# Altium footprint library DrPCB.PcbLib: 910 footprints (part 26 of 57)
Each footprint in its own frame and in the unit in brackets; x right, y up, seen from the top. Pads: shape width x height; smd on the part's side, far side on the other; paste and mask are expansions set on the pad; w line width, h text height; cw(c..) or ccw(c..) is an arc to the next point about the centre after c.
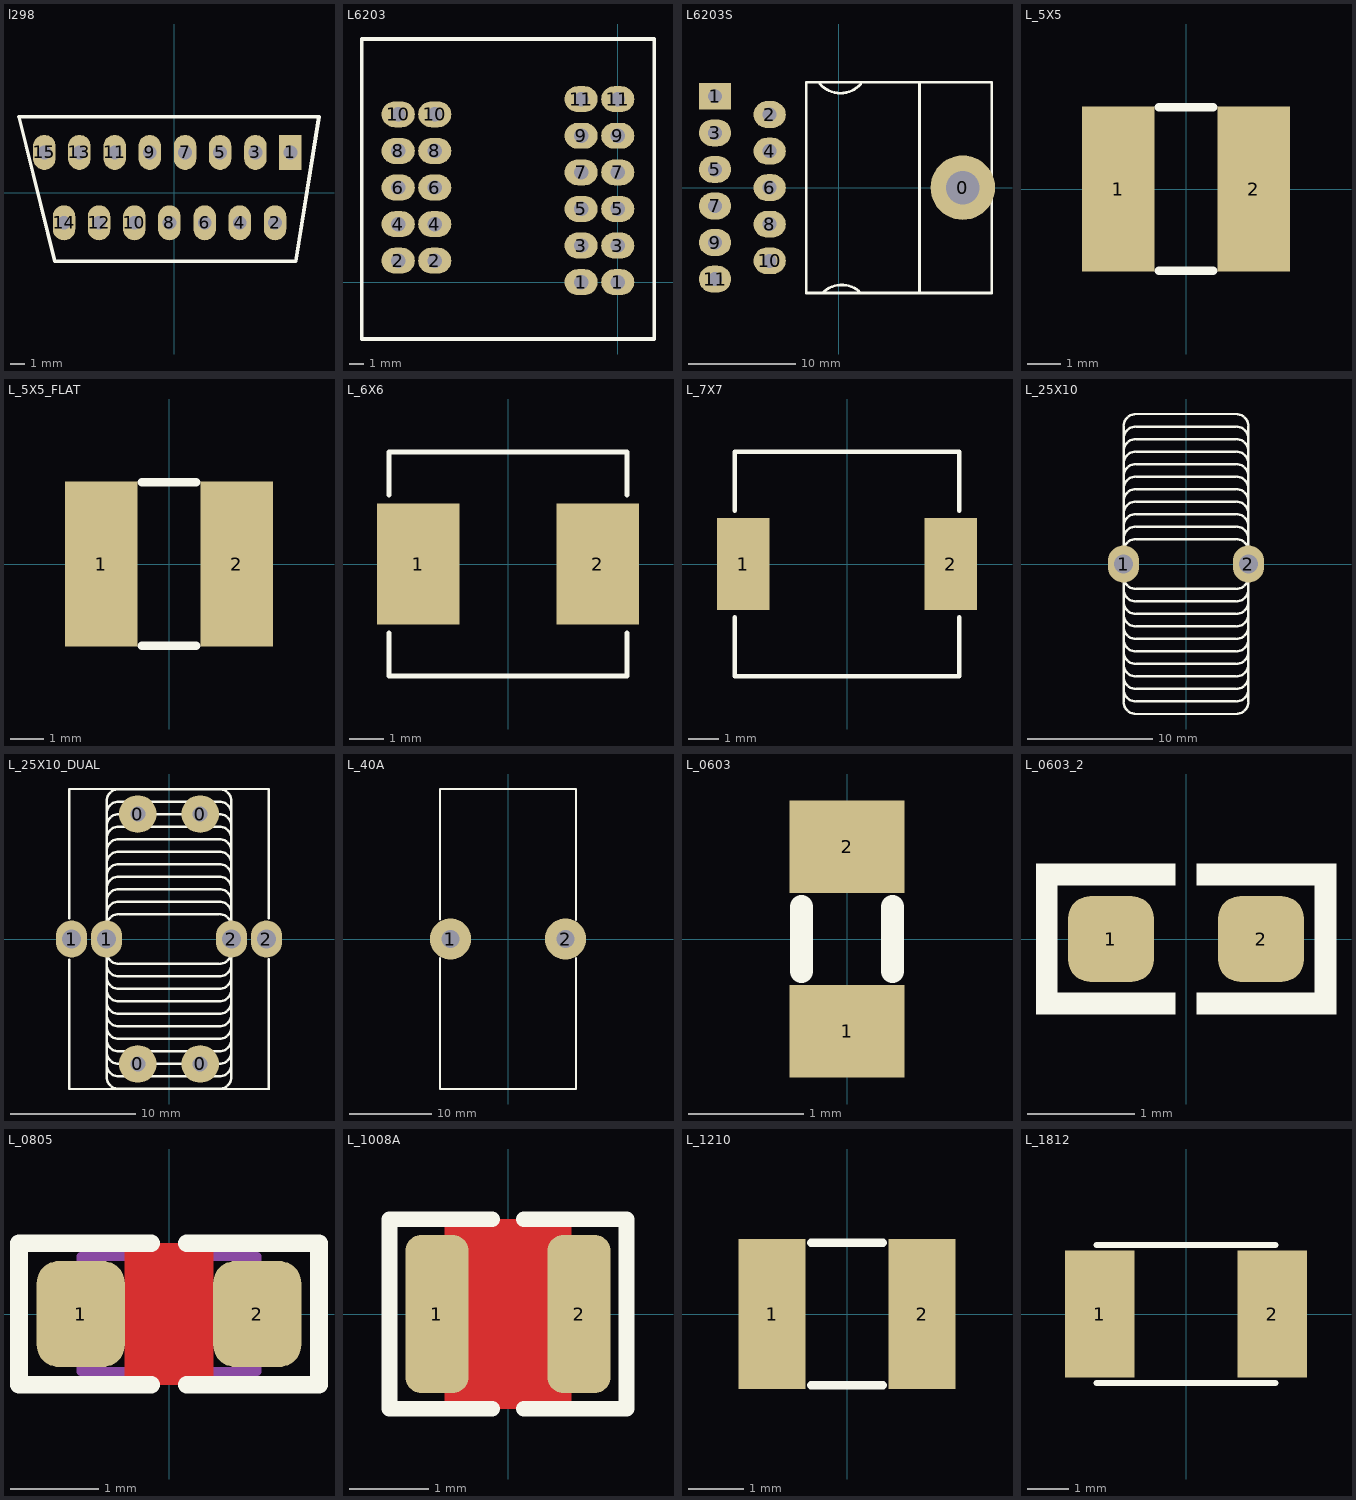
[diagram p25: the footprints below, top view; thin cyan lines are the x and y axes]

## l298 [mil]
pads (15):
  rect 63x98 hole 39: 1(325.31,112.4)
  oval 63x98 hole 39: 2(282.31,-84.6) 3(227.31,112.4) 4(183.31,-84.6) 5(128.31,112.4) 6(85.31,-84.6) 7(30.31,112.4) 8(-13.69,-84.6) 9(-68.69,112.4) 10(-111.69,-84.6) 11(-166.69,112.4) 12(-210.69,-84.6) 13(-265.69,112.4) 14(-308.69,-84.6) 15(-363.69,112.4)
Top Overlay:
  lines w10: -434.69,212.4 405.31,212.4 340.31,-192.6 -334.69,-192.6 -434.69,212.4

## L6203 [mm]
pads (22):
  oval 2.3x1.8 hole 1: 1(-2.54,0) 1(0,0) 2(-15.24,1.487) 2(-12.7,1.487) 3(-2.54,2.54) 3(0,2.54) 4(-15.24,4.027) 4(-12.7,4.027) 5(-2.54,5.08) 5(0,5.08) 6(-15.24,6.567) 6(-12.7,6.567) 7(-2.54,7.62) 7(0,7.62) 8(-15.24,9.107) 8(-12.7,9.107) 9(-2.54,10.16) 9(0,10.16) 10(-15.24,11.647) 10(-12.7,11.647) 11(-2.54,12.7) 11(0,12.7)
Top Overlay:
  lines w0.254: -17.78,-3.948 -17.78,16.876 ; -17.775,-3.948 2.545,-3.948 ; -17.775,16.876 2.545,16.876 ; 2.54,-3.948 2.54,16.859

## L6203S [mm]
pads (12):
  round 6 hole 3.1: 0(11.518,0)
  rect 3x2.5 hole 1.3: 1(-11.518,8.5)
  oval 3x2.5 hole 1.3: 2(-6.438,6.8) 3(-11.518,5.1) 4(-6.438,3.4) 5(-11.518,1.7) 6(-6.438,0) 7(-11.518,-1.7) 8(-6.438,-3.4) 9(-11.518,-5.1) 10(-6.438,-6.8) 11(-11.518,-8.5)
Top Overlay:
  lines w0.254: -1.773,9.652 ccw(c0.132,11.303) 2.037,9.652 ; -1.519,-9.779 cw(c0.259,-11.557) 2.037,-9.779 ; 7.498,-9.652 7.498,9.652 ; -3.032,-9.8 -3.032,9.8 14.218,9.8 14.218,-9.8 ; -3.032,-9.8 14.218,-9.8 ; -3.032,-9.8 14.218,-9.8

## L_5X5 [mm]
pads (2):
  rect 2.2x5 smd: 1(-2.05,0) 2(2.05,0)
Top Overlay:
  lines w0.254: -0.826,-2.476 0.826,-2.476 ; -0.826,2.475 0.826,2.475
3D body: height 0.25, standoff 0, extent -0.14,-0.445 -0.14,-0.445
3D body "User Library-SRN5040.STEP": height 4.01, standoff 0.01, extent -2.5,-2.5 2.5,2.5

## L_5X5_FLAT [mm]
pads (2):
  rect 2.2x5 smd: 1(-2.05,0) 2(2.05,0)
Top Overlay:
  lines w0.254: -0.826,-2.476 0.826,-2.476 ; -0.826,2.475 0.826,2.475
3D body: height 0.25, standoff 0, extent -0.14,-0.445 -0.14,-0.445
3D body "User Library-DLW5BT.STEP": height 2.45, standoff 0, extent -2.5,-2.5 2.5,2.5

## L_6X6 [mm]
pads (2):
  rect 2.4x3.5 smd: 1(-2.603,0) 2(2.603,0)
Top Overlay:
  lines w0.15: -3.45,-2.007 -3.45,-3.25 3.45,-3.25 3.45,-2.007 ; -3.45,2.007 -3.45,3.25 3.45,3.25 3.45,2.007
3D body "IHLP2525BD (1.5-10uH).STEP": height 2.28, standoff 0, extent -3.487,-3.335 3.487,3.335

## L_7X7 [mm]
pads (2):
  rect 1.7x3 smd: 1(-3.375,0) 2(3.375,0)
Top Overlay:
  lines w0.15: -3.65,-1.725 -3.65,-3.65 3.65,-3.65 3.65,-1.725 ; -3.65,1.725 -3.65,3.65 3.65,3.65 3.65,1.725
3D body "User Library-Murata_4600.step": height 4.55, standoff 0, extent -3.714,-3.65 3.714,3.65

## L_25X10 [mm] "INDUCTOR, TORIOD, 25.0X10.0mm"
pads (2):
  oval 2.5x3 hole 1.5: 1(-5,0) 2(5,0)
Top Overlay:
  lines w0.2: -5,-10 ccw(c-4,-10) -4,-11 4,-11 ccw(c4,-10) 5,-10 ; -5,-9 ccw(c-4,-9) -4,-10 4,-10 ccw(c4,-9) 5,-9 ; -5,-8 ccw(c-4,-8) -4,-9 4,-9 ccw(c4,-8) 5,-8 ; -5,-7 ccw(c-4,-7) -4,-8 4,-8 ccw(c4,-7) 5,-7 ; -5,-6 ccw(c-4,-6) -4,-7 4,-7 ccw(c4,-6) 5,-6 ; -5,-5 ccw(c-4,-5) -4,-6 4,-6 ccw(c4,-5) 5,-5 ; -5,-4 ccw(c-4,-4) -4,-5 4,-5 ccw(c4,-4) 5,-4 ; -5,-3 ccw(c-4,-3) -4,-4 4,-4 ccw(c4,-3) 5,-3 ; -5,-2 ccw(c-4,-2) -4,-3 4,-3 ccw(c4,-2) 5,-2 ; -5,-1.3 -5,-11 ccw(c-4,-11) -4,-12 4,-12 ccw(c4,-11) 5,-11 5,-1.3 ; -5,-1 ccw(c-4,-1) -4,-2 4,-2 ccw(c4,-1) 5,-1 ; -5,1 cw(c-4,1) -4,2 4,2 cw(c4,1) 5,1 ; -5,1.3 -5,11 cw(c-4,11) -4,12 4,12 cw(c4,11) 5,11 5,1.3 ; -5,2 cw(c-4,2) -4,3 4,3 cw(c4,2) 5,2 ; -5,3 cw(c-4,3) -4,4 4,4 cw(c4,3) 5,3 ; -5,4 cw(c-4,4) -4,5 4,5 cw(c4,4) 5,4 ; -5,5 cw(c-4,5) -4,6 4,6 cw(c4,5) 5,5 ; -5,6 cw(c-4,6) -4,7 4,7 cw(c4,6) 5,6 ; -5,7 cw(c-4,7) -4,8 4,8 cw(c4,7) 5,7 ; -5,8 cw(c-4,8) -4,9 4,9 cw(c4,8) 5,8 ; -5,9 cw(c-4,9) -4,10 4,10 cw(c4,9) 5,9 ; -5,10 cw(c-4,10) -4,11 4,11 cw(c4,10) 5,10
3D body "User Library-5701-RC.STEP": height 23.03, standoff -12, extent -5.62,-11.21 5.7,11.21

## L_25X10_DUAL [mm] "INDUCTOR, TORIOD, 25.0X10.0mm"
pads (8):
  round 3 hole 1.2: 0(-2.5,-10) 0(-2.5,10) 0(2.5,-10) 0(2.5,10)
  oval 2.5x3 hole 1.5: 1(-7.8,0) 1(-5,0) 2(5,0) 2(7.8,0)
Top Overlay:
  lines w0.2: -8,-1.65 -8,-12.002 7.988,-12.002 8,-11.99 8,-1.638 ; -8,1.65 -8,12.002 7.988,12.002 7.988,1.65 ; -5,-10 ccw(c-4,-10) -4,-11 4,-11 ccw(c4,-10) 5,-10 ; -5,-9 ccw(c-4,-9) -4,-10 4,-10 ccw(c4,-9) 5,-9 ; -5,-8 ccw(c-4,-8) -4,-9 4,-9 ccw(c4,-8) 5,-8 ; -5,-7 ccw(c-4,-7) -4,-8 4,-8 ccw(c4,-7) 5,-7 ; -5,-6 ccw(c-4,-6) -4,-7 4,-7 ccw(c4,-6) 5,-6 ; -5,-5 ccw(c-4,-5) -4,-6 4,-6 ccw(c4,-5) 5,-5 ; -5,-4 ccw(c-4,-4) -4,-5 4,-5 ccw(c4,-4) 5,-4 ; -5,-3 ccw(c-4,-3) -4,-4 4,-4 ccw(c4,-3) 5,-3 ; -5,-2 ccw(c-4,-2) -4,-3 4,-3 ccw(c4,-2) 5,-2 ; -5,-1.3 -5,-11 ccw(c-4,-11) -4,-12 4,-12 ccw(c4,-11) 5,-11 5,-1.3 ; -5,-1 ccw(c-4,-1) -4,-2 4,-2 ccw(c4,-1) 5,-1 ; -5,1 cw(c-4,1) -4,2 4,2 cw(c4,1) 5,1 ; -5,1.3 -5,11 cw(c-4,11) -4,12 4,12 cw(c4,11) 5,11 5,1.3 ; -5,2 cw(c-4,2) -4,3 4,3 cw(c4,2) 5,2 ; -5,3 cw(c-4,3) -4,4 4,4 cw(c4,3) 5,3 ; -5,4 cw(c-4,4) -4,5 4,5 cw(c4,4) 5,4 ; -5,5 cw(c-4,5) -4,6 4,6 cw(c4,5) 5,5 ; -5,6 cw(c-4,6) -4,7 4,7 cw(c4,6) 5,6 ; -5,7 cw(c-4,7) -4,8 4,8 cw(c4,7) 5,7 ; -5,8 cw(c-4,8) -4,9 4,9 cw(c4,8) 5,8 ; -5,9 cw(c-4,9) -4,10 4,10 cw(c4,9) 5,9 ; -5,10 cw(c-4,10) -4,11 4,11 cw(c4,10) 5,10
3D body "User Library-5701-RC.STEP": height 23.03, standoff -12, extent -5.62,-11.21 5.7,11.21

## L_40A [mm]
pads (2):
  round 5 hole 2.2: 1(-7,0) 2(7,0)
Top Overlay:
  lines w0.254: -8.25,-2.324 -8.25,-18.25 8.25,-18.25 ; -8.25,2.375 -8.25,18.25 8.25,18.25 8.25,2.337 ; 8.25,-18.224 8.25,-2.324

## L_0603 [mm]
pads (2):
  rect 1x0.8 smd: 1(0,-0.8) 2(0,0.8)
Top Overlay:
  lines w0.2: -0.394,-0.279 -0.394,0.279 ; 0.394,-0.279 0.394,0.279
3D body "INDC-0603.stp": height 0.95, standoff 0, extent -0.475,-0.875 0.475,0.875

## L_0603_2 [mm] "INDUCTOR, FERRITE BEAD, 0603, 1.6X0.8mm"
height 0.6
pads (2):
  rrect50% 0.8x0.8 smd paste-5 mask+0.075: 1(-0.7,0) 2(0.7,0)
Top Overlay:
  region: 0.1,-0.5 0.1,-0.7 1.4,-0.7 1.4,-0.5
  region: 0.1,0.5 0.1,0.7 1.4,0.7 1.4,0.5
  region: 1.4,0.7 1.2,0.7 1.2,-0.7 1.4,-0.7
  region: -1.4,0.7 -1.2,0.7 -1.2,-0.7 -1.4,-0.7
  region: -0.1,0.5 -0.1,0.7 -1.4,0.7 -1.4,0.5
  region: -0.1,-0.5 -0.1,-0.7 -1.4,-0.7 -1.4,-0.5
Top Paste:
  region: 0.7,0.35 0.63,0.35 0.502,0.297 0.403,0.198 0.35,0.07 0.35,0 0.35,-0.07 0.403,-0.198 0.502,-0.297 0.63,-0.35 0.7,-0.35 0.9,-0.35 0.93,-0.35 0.985,-0.327 1.027,-0.285 1.05,-0.23 1.05,-0.2 1.05,0.2 1.05,0.23 1.027,0.285 0.985,0.327 0.93,0.35 0.9,0.35
  region: -0.7,0.35 -0.63,0.35 -0.502,0.297 -0.403,0.198 -0.35,0.07 -0.35,0 -0.35,-0.07 -0.403,-0.198 -0.502,-0.297 -0.63,-0.35 -0.7,-0.35 -0.9,-0.35 -0.93,-0.35 -0.985,-0.327 -1.027,-0.285 -1.05,-0.23 -1.05,-0.2 -1.05,0.2 -1.05,0.23 -1.027,0.285 -0.985,0.327 -0.93,0.35 -0.9,0.35
3D body "User Library-Chip Inductor0603.step": height 0.95, standoff 0, extent -0.8,-0.4 0.8,0.4

## L_0805 [mm] "INDUCTOR, FERRITE BEAD, 0805, 2.0X1.3mm"
pads (2):
  rrect50% 1x1.2 smd paste-5 mask+0.075: 1(-1,0) 2(1,0)
Top Layer:
  pour cut-out: -0.5,0.8 0.5,0.8 0.5,-0.8 -0.5,-0.8
Top Overlay:
  lines w0.2: -0.2,-0.8 -1.7,-0.8 -1.7,0.8 -0.2,0.8 ; 0.2,-0.8 1.7,-0.8 1.7,0.8 0.2,0.8
Top Paste:
  region: 0.9,0.5 0.82,0.5 0.673,0.439 0.561,0.327 0.5,0.18 0.5,0.1 0.5,-0.1 0.5,-0.18 0.561,-0.327 0.673,-0.439 0.82,-0.5 0.9,-0.5 1.15,-0.5 1.18,-0.5 1.235,-0.477 1.277,-0.435 1.3,-0.38 1.3,-0.35 1.3,0.35 1.3,0.38 1.277,0.435 1.235,0.477 1.18,0.5 1.15,0.5
  region: -0.9,0.5 -0.82,0.5 -0.673,0.439 -0.561,0.327 -0.5,0.18 -0.5,0.1 -0.5,-0.1 -0.5,-0.18 -0.561,-0.327 -0.673,-0.439 -0.82,-0.5 -0.9,-0.5 -1.15,-0.5 -1.18,-0.5 -1.235,-0.477 -1.277,-0.435 -1.3,-0.38 -1.3,-0.35 -1.3,0.35 -1.3,0.38 -1.277,0.435 -1.235,0.477 -1.18,0.5 -1.15,0.5
Mechanical 13:
  lines w0.1: -1,-0.65 1,-0.65 1,0.65 -1,0.65 -1,-0.65
3D body "User Library-ind_0805.step": height 0.95, standoff 0, extent -1,-0.6 1,0.6

## L_1008A [mm] "INDUCTOR, 2520 1008, 2.5X2.0mm, for PCBA"
pads (2):
  rrect50% 0.8x2 smd paste-0.1: 1(-0.9,0) 2(0.9,0)
Top Layer:
  pour cut-out: -0.8,1.2 -0.8,-1.2 0.8,-1.2 0.8,1.2
Top Overlay:
  lines w0.2: -0.2,-1.2 -1.5,-1.2 -1.5,1.2 -0.2,1.2 ; 0.2,-1.2 1.5,-1.2 1.5,1.2 0.2,1.2
3D body: height 0.05, standoff 0, extent 0.65,-1 1.25,1
3D body: height 0.05, standoff 0, extent -1.25,-1 -0.65,1
3D body: height 1.2, standoff 0, extent 1.2,-1 1.25,1
3D body: height 1.2, standoff 0, extent -1.25,-1 -1.2,1
3D body: height 1.2, standoff 0.05, extent -1.2,-1 1.2,1

## L_1210 [mm]
pads (2):
  rect 1.2x2.7 smd: 1(-1.35,0) 2(1.35,0)
Top Overlay:
  lines w0.15: -0.648,-1.283 0.648,-1.283 ; -0.648,1.283 0.648,1.283
3D body "User Library-Chip Inductor.step": height 1.35, standoff 0, extent -1.6,-1.25 1.6,1.25

## L_1812 [mm]
pads (2):
  rect 1.7x3.1 smd: 1(-2.1,0) 2(2.1,0)
Top Overlay:
  lines w0.15: -2.172,-1.676 2.172,-1.676 ; -2.172,1.676 2.172,1.676
3D body "User Library-L_SMD.step": height 3.2, standoff 0, extent -2.25,-1.6 2.25,1.6